# Altium footprint library connectors.PCBLIB: 188 footprints (part 9 of 12)
Each footprint in its own frame and in the unit in brackets; x right, y up, seen from the top. Pads: shape width x height; smd on the part's side, far side on the other; paste and mask are expansions set on the pad; w line width, h text height; cw(c..) or ccw(c..) is an arc to the next point about the centre after c.
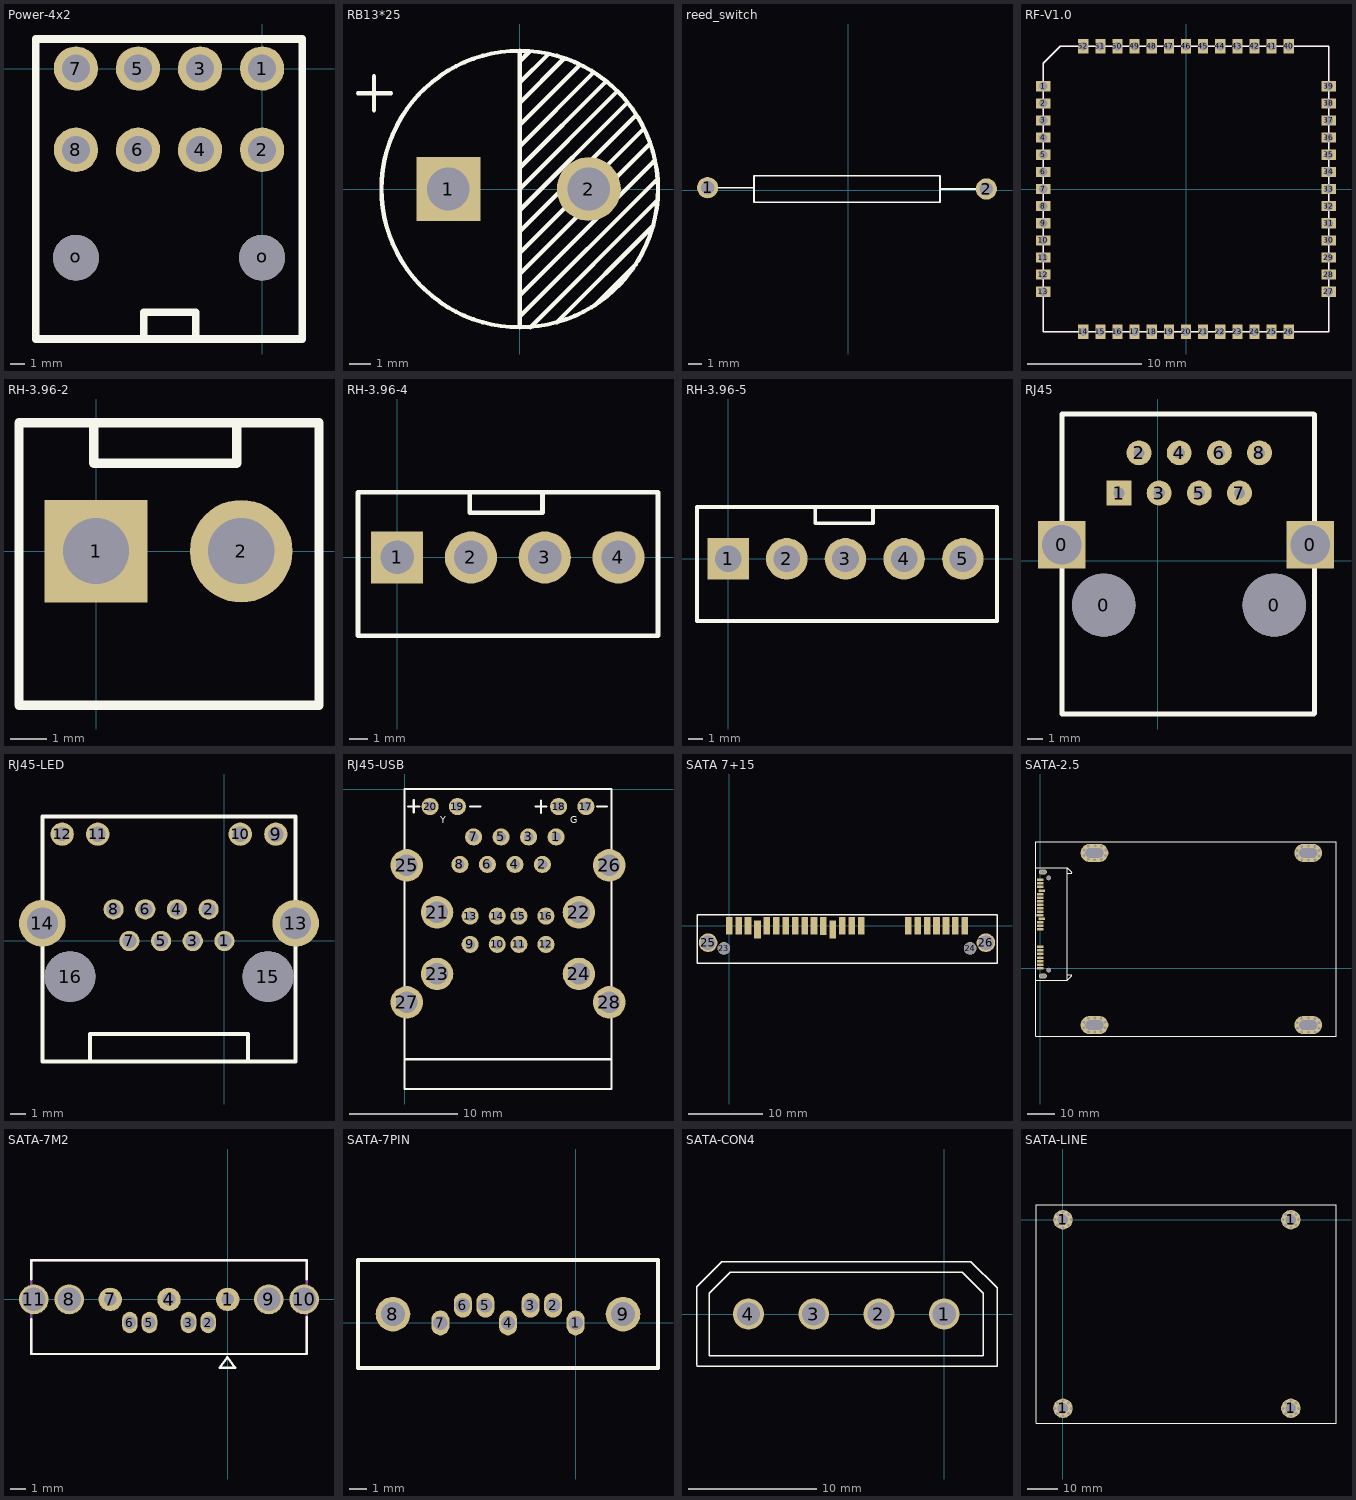
[diagram p8: the footprints below, top view; thin cyan lines are the x and y axes]

## Power-4x2 [mm]
pads (10):
  round 3 hole 1.9: 1(0,0) 2(0,-5.5) 3(-4.2,0) 4(-4.2,-5.5) 5(-8.4,0) 6(-8.4,-5.5) 7(-12.6,0) 8(-12.6,-5.5)
  round 3.1 hole 3.1: o(-12.6,-12.8) o(0,-12.8)
Top Overlay:
  lines w0.508: -8,-18.3 -8,-16.5 -4.5,-16.5 -4.5,-18.3 ; -15.3,-18.3 -14.3,-18.3 2.7,-18.3 2.7,1.7 2.7,2 -14.5,2 -15.3,2 -15.3,-18.3

## RB13*25 [mm]
pads (2):
  rect 3x3 hole 2: 1(-3.35,0)
  round 3 hole 2: 2(3.25,0)
Top Overlay:
  circle w0.2: c0,0 r6.5
  lines w0.2: -7.6,4.5 -6.05,4.5 ; -6.85,3.7 -6.85,5.3 ; 0,-6.45 0,6.45 ; 0,-6 6.45,0.45 ; 0,-5 6.275,1.275 ; 0,-4 6.1,2.1 ; 0,-3 5.8,2.8 ; 0,-2 5.475,3.475 ; 0,-1 5.05,4.05 ; 0,0 4.6,4.6 ; 0,2 3.475,5.475 ; 0,4 0,4.05 2.05,6.1 ; 0.45,6.45 0,6 ; 0.5,-6.5 6.475,-0.525 ; 1.3,6.3 0,5 ; 1.725,-6.275 6.275,-1.725 ; 2.8,5.8 0,3 ; 3.525,-5.475 5.45,-3.55 ; 4.05,5.05 0,1 0,3 ; 0,3 0,3 ; 0,5 0,5 ; 0,6 0,6

## reed_switch [mm]
pads (2):
  round 1.6 hole 1: 1(-10.6,0.2) 2(10.4,0.1)
Top Overlay:
  lines w0.127: -10,0.2 -7.1,0.2 ; 6.9,0.1 9.8,0.1 ; -7.1,-0.9 6.9,-0.9 6.9,1.1 -7.1,1.1 -7.1,-0.9

## RF-V1.0 [mil]
pads (52):
  rect 50x35 hole 30: 1(-492.13,354.33) 2(-492.13,295.28) 3(-492.13,236.22) 4(-492.13,177.17) 5(-492.13,118.11) 6(-492.13,59.06) 7(-492.13,0) 8(-492.13,-59.06) 9(-492.13,-118.11) 10(-492.13,-177.17) 11(-492.13,-236.22) 12(-492.13,-295.28) 13(-492.13,-354.33) 27(492.13,-354.33) 28(492.13,-295.28) 29(492.13,-236.22) 30(492.13,-177.17) 31(492.13,-118.11) 32(492.13,-59.06) 33(492.13,0) 34(492.13,59.06) 35(492.13,118.11) 36(492.13,177.17) 37(492.13,236.22) 38(492.13,295.28) 39(492.13,354.33)
  rect 35x50 hole 30: 14(-354.33,-492.13) 15(-295.28,-492.13) 16(-236.22,-492.13) 17(-177.17,-492.13) 18(-118.11,-492.13) 19(-59.06,-492.13) 20(0,-492.13) 21(59.06,-492.13) 22(118.11,-492.13) 23(177.17,-492.13) 24(236.22,-492.13) 25(295.28,-492.13) 26(354.33,-492.13) 40(354.33,492.13) 41(295.28,492.13) 42(236.22,492.13) 43(177.17,492.13) 44(118.11,492.13) 45(59.06,492.13) 46(0,492.13) 47(-59.06,492.13) 48(-118.11,492.13) 49(-177.17,492.13) 50(-236.22,492.13) 51(-295.28,492.13) 52(-354.33,492.13)
Top Overlay:
  lines w5: -492.13,-492.13 492.13,-492.13 492.13,492.13 -433.07,492.13 -492.13,433.07 -492.13,-492.13
Keep-Out Layer:
  lines w5: 492.13,-492.13 492.13,492.13 -433.07,492.13 -492.13,433.07 -492.13,-492.13 492.13,-492.13 ; 492.13,-492.13 492.13,-492.13

## RH-3.96-2 [mm]
pads (2):
  rect 2.8x2.8 hole 1.8: 1(0,0)
  round 2.8 hole 1.8: 2(3.96,0)
Top Overlay:
  lines w0.254: -0.06,3.5 -0.06,2.4 3.84,2.4 3.84,3.5 ; -2.1,-4.2 -2.1,3.5 6.08,3.5 6.08,-4.2 -2.1,-4.2

## RH-3.96-4 [mm]
pads (4):
  rect 2.8x2.8 hole 1.8: 1(0,0)
  round 2.8 hole 1.8: 2(3.96,0) 3(7.92,0) 4(11.88,0)
Top Overlay:
  lines w0.254: 3.9,3.5 3.9,2.4 7.8,2.4 7.8,3.5 ; -2.1,-4.2 -2.1,3.5 14,3.5 14,-4.2 -2.1,-4.2

## RH-3.96-5 [mm]
pads (5):
  rect 2.8x2.8 hole 1.8: 1(0,0)
  round 2.8 hole 1.8: 2(3.96,0) 3(7.92,0) 4(11.88,0) 5(15.85,0)
Top Overlay:
  lines w0.254: 5.875,3.5 5.875,2.4 9.775,2.4 9.775,3.5 ; -2.1,-4.2 18.15,-4.2 18.15,3.5 -2.1,3.5 -2.1,-4.2

## RJ45 [mil]
pads (12):
  rect 118.11x118.11 hole 98.42: 0(-240,40) 0(380,40)
  round 157.48 hole 157.48: 0(-135,-110) 0(290,-110)
  rect 62x62 hole 28: 1(-96.89,169.37)
  round 62 hole 28: 2(-46.89,269.37) 3(3.11,169.37) 4(53.11,269.37) 5(103.11,169.37) 6(153.11,269.37) 7(203.11,169.37) 8(253.11,269.37)
Top Overlay:
  lines w12: 388.78,-381.22 352.52,-381.22 -188.03,-381.22 -238.78,-381.22 -238.78,366.22 -213.78,366.22 -187.64,366.22 353.11,366.22 388.2,366.22 389.76,364.65 390,364.65 390,-380

## RJ45-LED [mm]
pads (16):
  round 1.3 hole 0.9: 1(0,0) 2(-1.016,2.032) 3(-2.032,0) 4(-3.048,2.032) 5(-4.064,0) 6(-5.08,2.032) 7(-6.096,0) 8(-7.112,2.032)
  round 1.5 hole 1: 9(3.302,6.858) 10(1.016,6.858) 11(-8.128,6.858)
  round 1.5 hole 0.9: 12(-10.414,6.858)
  round 3 hole 2: 13(4.572,1.143) 14(-11.684,1.143)
  round 3.251 hole 3.251: 15(2.794,-2.286) 16(-9.906,-2.286)
Top Overlay:
  lines w0.254: -8.636,-7.747 -8.636,-5.969 1.524,-5.969 1.524,-7.747 ; -11.684,-7.747 4.572,-7.747 4.572,1.143 4.572,8.001 -11.684,8.001 -11.684,1.143 -11.684,-7.747

## RJ45-USB [mm]
pads (28):
  round 1.575 hole 0.9: 1(13.995,-4.43) 2(12.725,-6.97) 3(11.455,-4.43) 4(10.185,-6.97) 5(8.915,-4.43) 6(7.645,-6.97) 7(6.375,-4.43) 8(5.105,-6.97) 9(6.055,-14.35) 10(8.555,-14.35) 11(10.555,-14.35) 12(13.055,-14.35) 13(6.055,-11.73) 14(8.555,-11.73) 15(10.555,-11.73) 16(13.055,-11.73) 17(16.75,-1.62) 18(14.215,-1.62) 19(4.885,-1.62) 20(2.35,-1.62)
  round 3 hole 2: 21(3,-11.39) 22(16.1,-11.39) 23(3,-17.07) 24(16.1,-17.07) 25(0.2,-7.05) 26(18.9,-7.05) 27(0.2,-19.7) 28(18.9,-19.7)
Top Overlay:
  lines w0.2: 0,-24.95 19.05,-24.95 19.1,-24.9 ; 0.32,-1.61 1.35,-1.61 ; 0.85,-2.18 0.85,-1.04 ; 6.06,-1.61 6.99,-1.61 ; 12.08,-1.62 13.11,-1.62 ; 12.61,-2.19 12.61,-1.05 ; 17.77,-1.62 18.7,-1.62 ; 0,0 0,0 ; 0,0 0,-27.7 19.1,-27.7 19.1,0 0,0
  text "Y" at 3.3,-3.14 h0.64
  text "G" at 15.28,-3.17 h0.64

## SATA 7+15 [mm]
pads (26):
  rect 0.9x2.4 smd: 1(31.75,0) 2(30.48,0) 3(29.21,0) 4(27.94,0) 5(26.67,0) 6(25.4,0) 7(24.13,0) 8(17.78,0) 9(16.51,0) 10(15.24,0) 11(13.97,-0.508) 12(12.675,-0.048) 13(11.43,0) 14(10.16,0) 15(8.89,0) 16(7.62,0) 17(6.35,0) 18(5.08,0) 19(3.81,-0.508) 20(2.54,0) 21(1.27,0) 22(0,0)
  round 1.7 hole 1.6: 23(-0.725,-3.048) 24(32.475,-3.048)
  round 2.5 hole 2: 25(-2.84,-2.286) 26(34.59,-2.286)
Top Overlay:
  lines w0.2: -4.34,-5.08 36.09,-5.08 36.09,1.458 36.046,1.502 -4.34,1.502 -4.34,-5.08

## SATA-2.5 [mm]
pads (30):
  rect 2.4x0.9 smd: 1(0,0) 2(0,1.27) 3(0,2.54) 4(0,3.81) 5(0,5.08) 6(0,6.35) 7(0,7.62) 8(0,13.97) 9(0,15.24) 10(0,16.51) 11(0.592,17.78) 12(-0.048,19.075) 13(0,20.32) 14(0,21.59) 15(0,22.86) 16(0,24.13) 17(0,25.4) 18(0,26.67) 19(0.592,27.94) 20(0,29.21) 21(0,30.48) 22(0,31.75)
  round 1.7 hole 1.6: 23(3.048,-0.725) 24(3.048,32.475)
  oval 2.88x1.8 hole 1 slot 2.08 at 0 deg: 25(0.986,-2.84) 25(0.986,34.61)
  oval 10x6.5 hole 3.5 slot 6.5 at 0 deg: ""(19.548,-20.525) ""(19.548,41.475) ""(96.548,-20.525) ""(96.548,41.475)
via 19.598,39.025 diameter 1.3 hole 1
via 92.598,42.375 diameter 1.3 hole 1
via 94.198,39.025 diameter 1.3 hole 1
via 92.598,40.375 diameter 1.3 hole 1
via 96.648,43.925 diameter 1.3 hole 1
via 98.898,43.825 diameter 1.3 hole 1
via 100.448,42.375 diameter 1.3 hole 1
via 100.398,40.375 diameter 1.3 hole 1
via 98.948,39.025 diameter 1.3 hole 1
via 96.648,38.975 diameter 1.3 hole 1
via 94.198,43.825 diameter 1.3 hole 1
via 96.648,-23.075 diameter 1.3 hole 1
via 98.948,-23.025 diameter 1.3 hole 1
via 100.398,-21.675 diameter 1.3 hole 1
via 100.448,-19.675 diameter 1.3 hole 1
via 96.648,-18.025 diameter 1.3 hole 1
via 94.198,-23.025 diameter 1.3 hole 1
via 92.598,-19.675 diameter 1.3 hole 1
via 19.648,-23.025 diameter 1.3 hole 1
via 21.948,-22.875 diameter 1.3 hole 1
via 23.398,-21.475 diameter 1.3 hole 1
via 23.398,-19.525 diameter 1.3 hole 1
via 15.748,-21.475 diameter 1.3 hole 1
via 17.398,-22.925 diameter 1.3 hole 1
via 15.748,-19.475 diameter 1.3 hole 1
via 19.648,-17.975 diameter 1.3 hole 1
via 21.898,-18.125 diameter 1.3 hole 1
via 17.398,-18.125 diameter 1.3 hole 1
via 92.648,-21.675 diameter 1.3 hole 1
via 17.348,43.975 diameter 1.3 hole 1
via 22.098,39.175 diameter 1.3 hole 1
via 23.548,40.525 diameter 1.3 hole 1
via 23.598,42.525 diameter 1.3 hole 1
via 22.048,43.975 diameter 1.3 hole 1
via 15.748,40.525 diameter 1.3 hole 1
via 17.348,39.175 diameter 1.3 hole 1
via 15.748,42.525 diameter 1.3 hole 1
via 19.798,44.075 diameter 1.3 hole 1
via 94.148,-18.175 diameter 1.3 hole 1
via 98.998,-18.225 diameter 1.3 hole 1
Top Overlay:
  lines w0.2: -1.502,-4.34 5.08,-4.34 9.83,-4.34 ; -1.458,36.09 5.08,36.09 9.83,36.09 ; 9.83,-2.44 11.38,-2.44 11.38,-2.79 9.83,-4.34 ; 9.83,34.19 11.38,34.19 11.38,34.54 9.83,36.09 ; 19.548,-24.525 106.548,-24.525 106.548,45.475 95.998,45.475 ; 19.898,-24.525 -1.502,-24.525 -1.502,45.475 19.548,45.475 ; 9.83,-4.34 9.83,36.09 ; 19.548,45.475 96.548,45.475 ; 19.548,45.475 96.548,45.475 ; 19.548,45.475 96.548,45.475 ; 19.548,45.475 96.548,45.475

## SATA-7M2 [mil]
pads (11):
  round 60 hole 32: 1(0,0) 4(-150,0) 7(-300,0)
  oval 40x55 hole 32: 2(-50,-59.06) 3(-100,-59.06) 5(-200,-59.06) 6(-250,-59.06)
  round 76 hole 60: 8(-405.12,0) 9(105.12,0) 10(195.47,0) 11(-495.47,0)
Top Overlay:
  lines w6: -502.36,-50.06 -502.36,-139.77 202.36,-139.77 202.36,-45.36 ; -502.36,51.44 -502.36,100.39 202.36,100.39 202.36,50.68 ; -20.35,-175.04 19.02,-175.04 -0.67,-147.49 -20.35,-175.04
Mechanical 10:
  text "10" at 211.47,0 h20
  text "11" at -479.47,0 h20
  text "6" at -242,-59.06 h20
  text "5" at -192,-59.06 h20
  text "3" at -92,-59.06 h20
  text "2" at -42,-59.06 h20
  text "8" at -397.12,0 h20
  text "1" at 8,0 h20
  text "4" at -142,0 h20
  text "7" at -292,0 h20
  text "9" at 113.12,0 h20
Mechanical 13:
  lines w6: -502.36,-139.77 -502.36,100.39 202.36,100.39 202.36,-139.77 -502.36,-139.77

## SATA-7PIN [mil]
pads (9):
  oval 40x55 hole 32: 1(0,0) 2(-50,39.37) 3(-100,39.37) 4(-150,0) 5(-200,39.37) 6(-250,39.37) 7(-300,0)
  round 76.77 hole 53.15: 8(-405.12,19.68) 9(105.12,19.68)
Top Overlay:
  lines w9.65: -482.68,-100 182.68,-100 182.68,139.77 -482.68,139.77 -482.68,-100
Mechanical 10:
  text "10" at 138.53,0 h20

## SATA-CON4 [mm]
pads (4):
  round 2.4 hole 1.8: 1(0,0) 2(-5.08,0) 3(-10.16,0) 4(-15.24,0)
Top Overlay:
  lines w0.1: -19.25,-4.08 4.11,-4.08 4.11,2.04 2.07,4.08 -17.31,4.08 -19.25,2.14 -19.25,1.63 -19.25,-3.26 -19.25,-3.98 ; -18.29,1.62 -18.29,0 -18.29,-3.25 3.05,-3.25 3.05,0 3.05,1.62 ; -18.29,1.63 -16.66,3.26 1.42,3.26 3.05,1.63

## SATA-LINE [mm]
pads (4):
  round 6.5 hole 3.5: 1(0,-62.898) 1(0,0) 1(76,0) 1(76,-62.898)
via 2.6,-62.898 diameter 1.3 hole 1
via 1.8,-64.698 diameter 1.3 hole 1
via 0,-65.498 diameter 1.3 hole 1
via -1.8,-64.698 diameter 1.3 hole 1
via -2.6,-62.898 diameter 1.3 hole 1
via -1.8,-61.098 diameter 1.3 hole 1
via 1.8,-61.098 diameter 1.3 hole 1
via 0,-60.298 diameter 1.3 hole 1
via 2.6,0 diameter 1.3 hole 1
via 1.8,-1.8 diameter 1.3 hole 1
via 0,-2.6 diameter 1.3 hole 1
via -1.8,-1.8 diameter 1.3 hole 1
via -2.6,0 diameter 1.3 hole 1
via -1.8,1.8 diameter 1.3 hole 1
via 1.8,1.8 diameter 1.3 hole 1
via 0,2.6 diameter 1.3 hole 1
via 76,2.6 diameter 1.3 hole 1
via 77.8,1.8 diameter 1.3 hole 1
via 74.2,1.8 diameter 1.3 hole 1
via 73.4,0 diameter 1.3 hole 1
via 74.2,-1.8 diameter 1.3 hole 1
via 76,-2.6 diameter 1.3 hole 1
via 77.8,-1.8 diameter 1.3 hole 1
via 78.6,0 diameter 1.3 hole 1
via 76,-60.298 diameter 1.3 hole 1
via 77.8,-61.098 diameter 1.3 hole 1
via 74.2,-61.098 diameter 1.3 hole 1
via 73.4,-62.898 diameter 1.3 hole 1
via 74.2,-64.698 diameter 1.3 hole 1
via 76,-65.498 diameter 1.3 hole 1
via 77.8,-64.698 diameter 1.3 hole 1
via 78.6,-62.898 diameter 1.3 hole 1
Top Overlay:
  lines w0.254: -9,-67.898 -9,5 91.076,5 91.076,-67.898 -9,-67.898